# Altium footprint library hand_ad_lib.PcbLib: 105 footprints (part 6 of 7)
Each footprint in its own frame and in the unit in brackets; x right, y up, seen from the top. Pads: shape width x height; smd on the part's side, far side on the other; paste and mask are expansions set on the pad; w line width, h text height; cw(c..) or ccw(c..) is an arc to the next point about the centre after c.
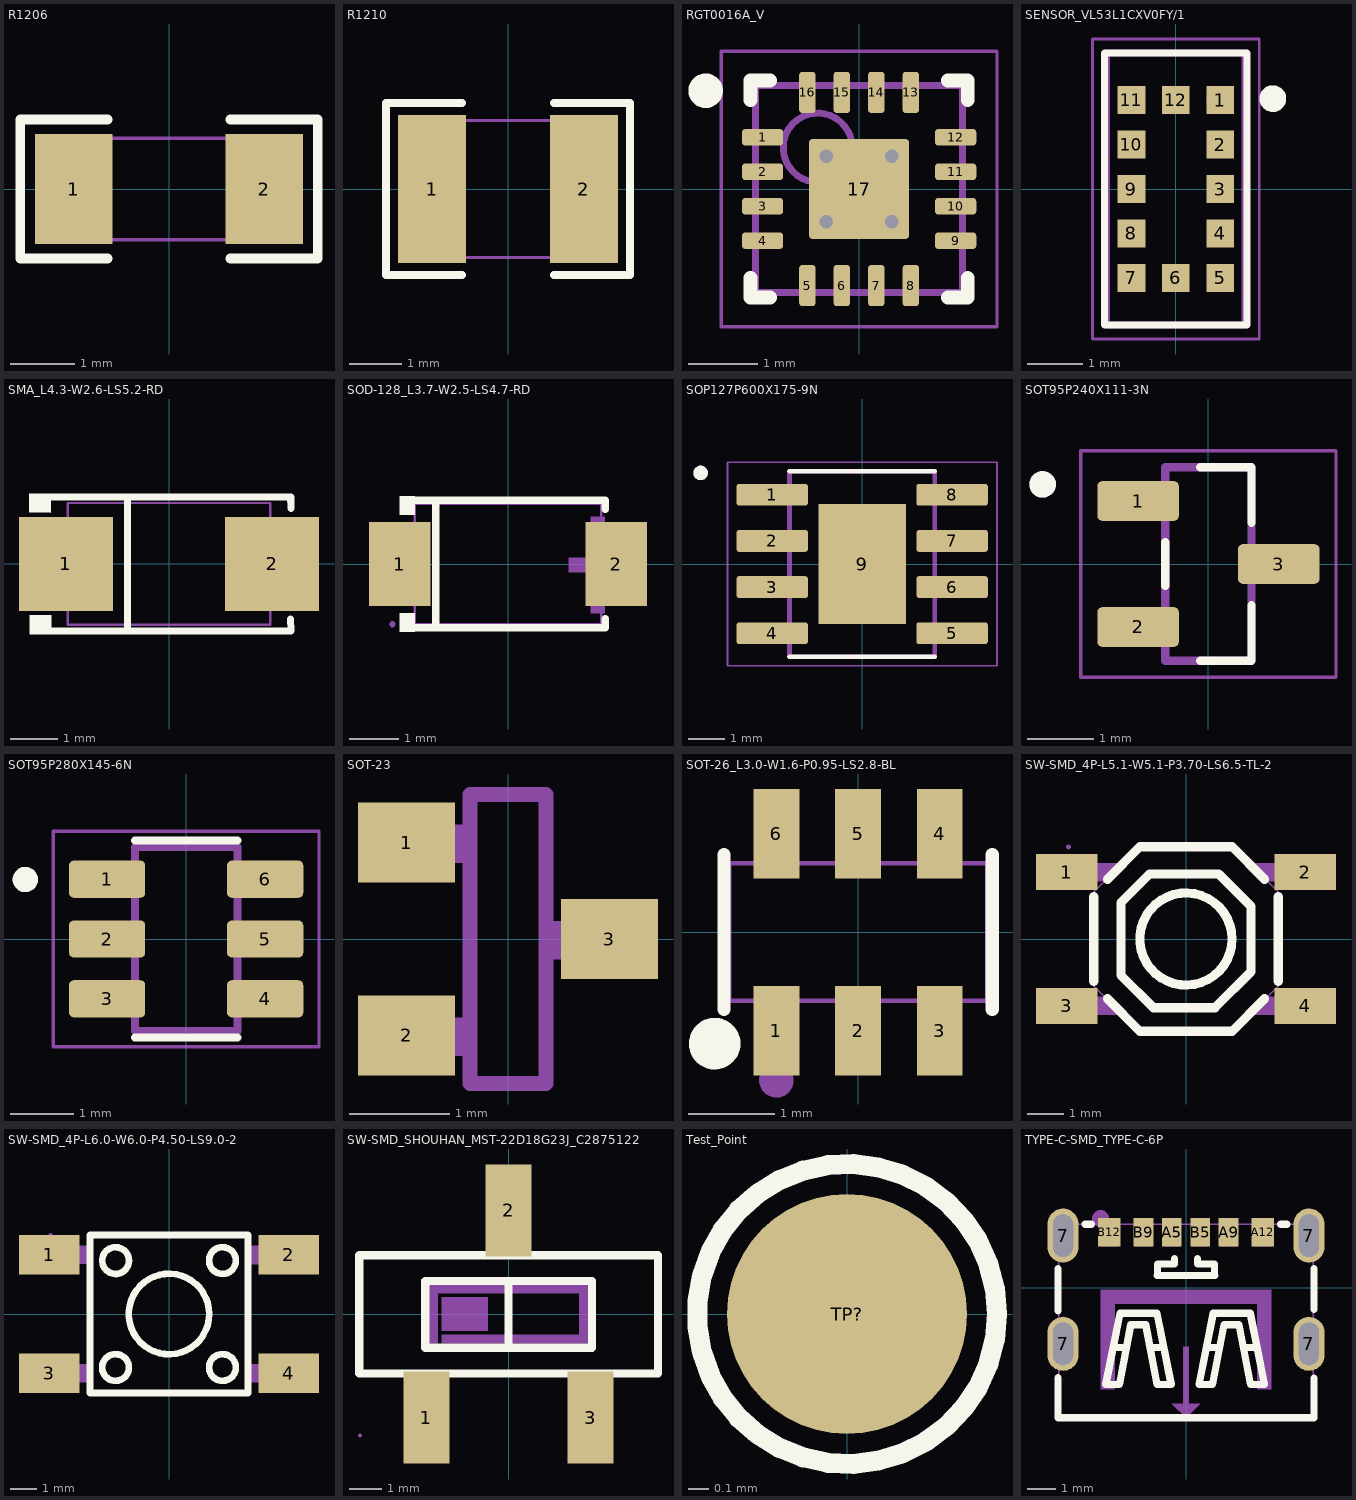
[diagram p5: the footprints below, top view; thin cyan lines are the x and y axes]

## R1206 [mm]
pads (2):
  rect 1.208x1.701 smd paste-100 mask+0.051: 1(-1.479,0) 2(1.479,0)
Top Overlay:
  lines w0.152: -0.951,-1.079 -2.311,-1.079 -2.311,1.079 -0.951,1.079 ; 0.951,-1.079 2.311,-1.079 2.311,1.079 0.951,1.079
Top Paste:
  region: 0.875,-0.75 0.875,-0.389 0.975,-0.289 1.186,-0.289 1.286,-0.189 1.286,0.189 1.186,0.289 0.975,0.289 0.875,0.389 0.875,0.75 0.975,0.85 1.983,0.85 2.083,0.75 2.083,-0.75 1.983,-0.85 0.975,-0.85
  region: -0.875,-0.75 -0.875,-0.389 -0.975,-0.289 -1.186,-0.289 -1.286,-0.189 -1.286,0.189 -1.186,0.289 -0.975,0.289 -0.875,0.389 -0.875,0.75 -0.975,0.85 -1.983,0.85 -2.083,0.75 -2.083,-0.75 -1.983,-0.85 -0.975,-0.85
Mechanical 15:
  region: -1.49,-0.787 -1.491,-0.763 -1.526,-0.729 -1.574,-0.729 -1.609,-0.763 -1.61,-0.788 -1.61,-0.787 -1.609,-0.812 -1.574,-0.846 -1.526,-0.846 -1.491,-0.812
  region: -1.55,-0.788 -1.55,0.788 -1.1,0.788 -1.1,-0.788
  region: 1.55,-0.788 1.55,0.788 1.1,0.788 1.1,-0.788
  lines w0.051: -1.55,-0.788 -1.55,0.788 1.55,0.788 1.55,-0.788 -1.55,-0.788
3D body "HoYH1206-1W-200mR.x_t": height 0.56, standoff 0, extent -1.6,-0.8 1.6,0.801

## R1210 [mm]
pads (2):
  rect 1.283x2.808 smd paste-100 mask+0.051: 1(-1.441,0) 2(1.441,0)
Top Overlay:
  lines w0.152: -0.876,-1.633 -2.311,-1.633 -2.311,1.633 -0.876,1.633 ; 0.876,-1.633 2.311,-1.633 2.311,1.633 0.876,1.633
Top Paste:
  region: 0.8,-1.304 0.8,-0.577 0.9,-0.477 1.136,-0.477 1.236,-0.377 1.236,0.377 1.136,0.477 0.9,0.477 0.8,0.577 0.8,1.304 0.9,1.404 1.983,1.404 2.083,1.304 2.083,-1.304 1.983,-1.404 0.9,-1.404
  region: -0.8,-1.304 -0.8,-0.577 -0.9,-0.477 -1.136,-0.477 -1.236,-0.377 -1.236,0.377 -1.136,0.477 -0.9,0.477 -0.8,0.577 -0.8,1.304 -0.9,1.404 -1.983,1.404 -2.083,1.304 -2.083,-1.304 -1.983,-1.404 -0.9,-1.404
Mechanical 15:
  region: -1.49,-1.3 -1.491,-1.276 -1.526,-1.242 -1.574,-1.242 -1.609,-1.276 -1.61,-1.3 -1.609,-1.324 -1.574,-1.358 -1.526,-1.358 -1.491,-1.324
  region: -1.55,-1.3 -1.55,1.3 -1.05,1.3 -1.05,-1.3
  region: 1.55,-1.3 1.55,1.3 1.05,1.3 1.05,-1.3
  lines w0.051: -1.55,-1.3 -1.55,1.3 1.55,1.3 1.55,-1.3 -1.55,-1.3
3D body "1210W2F300LT5E.x_t": height 0.55, standoff 0, extent -1.55,-1.3 1.55,1.301

## RGT0016A_V [mm] "QFN, 16-Leads, Body 3x3mm, Pitch 0.5mm, Thermal Pad 1.45x1.45mm"
height 1
pads (17):
  rrect42% 0.6x0.24 smd: 1(-1.4,0.75) 2(-1.4,0.25) 3(-1.4,-0.25) 4(-1.4,-0.75) 9(1.4,-0.75) 10(1.4,-0.25) 11(1.4,0.25) 12(1.4,0.75)
  rrect42% 0.24x0.6 smd: 5(-0.75,-1.4) 6(-0.25,-1.4) 7(0.25,-1.4) 8(0.75,-1.4) 13(0.75,1.4) 14(0.25,1.4) 15(-0.25,1.4) 16(-0.75,1.4)
  rrect7% 1.45x1.45 smd paste-0.725: 17(0,0)
via 0.475,0.475 diameter 0.5 hole 0.2
via 0.475,-0.475 diameter 0.5 hole 0.2
via -0.475,-0.475 diameter 0.5 hole 0.2
via -0.475,0.475 diameter 0.5 hole 0.2
Top Overlay:
  circle w0.25: c-2.225,1.425 r0.125
  lines w0.2: -1.575,-1.29 -1.575,-1.575 -1.29,-1.575 ; -1.575,1.29 -1.575,1.575 -1.29,1.575 ; 1.29,-1.575 1.575,-1.575 1.575,-1.29 ; 1.29,1.575 1.575,1.575 1.575,1.29
Mechanical 1:
  text ".Designator" at -1.4,-0.75 h0.5
Mechanical 13:
  circle w0.1: c-0.6,0.6 r0.5
  lines w0.1: -1.5,-1.5 -1.5,1.5 1.5,1.5 1.5,-1.5 -1.5,-1.5
Mechanical 15:
  lines w0.05: -2,-2 -2,2 2,2 2,-2 -2,-2
  lines w0.1: -0.5,0 0.5,0 ; 0,-0.5 0,0.5
3D body: height 1, standoff 0, extent -1.5,-1.5 1.5,1.5

## SENSOR_VL53L1CXV0FY/1 [mm]
pads (12):
  rect 0.5x0.5 smd: 1(0.8,1.6) 2(0.8,0.8) 3(0.8,0) 4(0.8,-0.8) 5(0.8,-1.6) 6(0,-1.6) 7(-0.8,-1.6) 8(-0.8,-0.8) 9(-0.8,0) 10(-0.8,0.8) 11(-0.8,1.6) 12(0,1.6)
Top Overlay:
  circle w0.24: c1.746,1.627 r0.12
  lines w0.127: -1.28,-2.45 1.28,-2.45 1.28,2.45 -1.28,2.45 -1.28,-2.45
Mechanical 13:
  circle w0.3: c0.8,1.6 r0.1
  lines w0.127: -1.25,-2.45 -1.25,2.45 1.25,2.45 1.25,-2.45 -1.25,-2.45
Mechanical 15:
  lines w0.05: -1.5,-2.7 -1.5,2.7 1.5,2.7 1.5,-2.7 -1.5,-2.7
3D body "step_temp.STEP": height 1.6, standoff 0, extent -1.25,-2.45 1.25,2.45

## SMA_L4.3-W2.6-LS5.2-RD [mm]
pads (2):
  rect 2x2 smd: 1(-2.2,0) 2(2.2,0)
Top Overlay:
  region: -2.512,-1.096 -2.513,-1.503 -2.973,-1.498 -2.969,-1.096
  region: -2.52,1.502 -2.521,1.096 -2.981,1.1 -2.977,1.502
  lines w0.152: -2.596,-1.426 2.596,-1.426 ; -2.596,1.426 2.596,1.426 2.603,1.187 ; -0.884,-1.426 -0.884,1.426 ; 2.593,-1.176 2.6,-1.415
Mechanical 6:
  region: 2.014,-0.675 2.014,0.675 1.811,0.675 1.811,-0.675
  region: 2.29,-0.09 2.29,0.112 1.48,0.112 1.48,-0.09
  region: -2.317,-0.101 -2.317,0.101 -1.507,0.101 -1.507,-0.101
Mechanical 15:
  region: -1.48,0.725 -1.48,-0.725 -2.605,-0.725 -2.605,0.725
  region: 2.605,0.725 2.605,-0.725 1.48,-0.725 1.48,0.725
  region: -2.545,-1.3 -2.546,-1.275 -2.58,-1.241 -2.629,-1.241 -2.664,-1.275 -2.665,-1.3 -2.664,-1.324 -2.63,-1.359 -2.581,-1.359 -2.546,-1.324
  lines w0.051: -2.16,-1.3 2.16,-1.3 2.16,1.3 -2.16,1.3 -2.16,-1.3
3D body "SS34.x_t": height 2.1, standoff 0, extent -2.35,-1.3 2.35,1.3

## SOD-128_L3.7-W2.5-LS4.7-RD [mm]
pads (2):
  rect 1.25x1.7 smd: 1(-2.2,0) 2(2.2,0)
Top Overlay:
  region: -1.9,-1.377 -1.9,-1 -2.205,-1 -2.205,-1.377
  region: -1.9,1.377 -1.9,1 -2.205,1 -2.205,1.377
  lines w0.152: -1.976,-1.301 1.976,-1.301 1.976,-1.108 ; -1.976,1.301 1.976,1.301 1.976,1.108 ; -1.467,-1.301 -1.467,1.301
Mechanical 6:
  region: 1.972,0.96 1.972,-1 1.678,-1 1.678,0.96
  region: 2.413,0.127 2.413,-0.167 1.237,-0.167 1.237,0.127
  region: -2.794,0.254 -2.794,-0.04 -1.618,-0.04 -1.618,0.254
Mechanical 15:
  region: 2.35,-0.7 2.35,0.7 1.6,0.7 1.6,-0.7
  region: -2.35,-0.7 -2.35,0.7 -1.6,0.7 -1.6,-0.7
  region: -2.29,-1.225 -2.291,-1.201 -2.326,-1.168 -2.374,-1.168 -2.409,-1.201 -2.41,-1.225 -2.409,-1.249 -2.374,-1.282 -2.326,-1.282 -2.291,-1.249
  lines w0.051: -1.9,-1.225 1.9,-1.225 1.9,1.225 -1.9,1.225 -1.9,-1.225
3D body "PDZVTR5.1B.x_t": height 0.96, standoff 0, extent -2.35,-1.245 2.35,1.245

## SOP127P600X175-9N [mm]
height 1.75
pads (9):
  rrect25% 1.97x0.6 smd: 1(-2.475,1.905) 2(-2.475,0.635) 3(-2.475,-0.635) 4(-2.475,-1.905) 5(2.475,-1.905) 6(2.475,-0.635) 7(2.475,0.635) 8(2.475,1.905)
  rect 2.413x3.302 smd paste-3: 9(0,0)
Top Overlay:
  circle w0.2: c-4.445,2.505 r0.1
  lines w0.127: -2,-2.55 2,-2.55 ; -2,2.55 2,2.55
Top Paste:
  region: 0.645,-0.82 -0.645,-0.82 -0.645,0.82 0.645,0.82
Mechanical 13:
  circle w0.2: c-4.445,2.505 r0.1
  lines w0.127: -2,-2.55 -2,2.55 2,2.55 2,-2.55 -2,-2.55
Mechanical 15:
  lines w0.05: -3.71,-2.8 -3.71,2.8 3.71,2.8 3.71,-2.8 -3.71,-2.8
3D body "step_temp.STEP": height 1.75, standoff 0, extent -3,-2.45 3,2.45

## SOT95P240X111-3N [mm]
height 1.11
pads (3):
  rrect25% 1.23x0.6 smd: 1(-1.06,0.95) 2(-1.06,-0.95) 3(1.06,0)
Top Overlay:
  circle w0.2: c-2.5,1.2 r0.1
  lines w0.127: -0.65,-0.33 -0.65,0.33 ; -0.125,-1.46 0.65,-1.46 0.65,-0.62 ; -0.125,1.46 0.65,1.46 0.65,0.62
Mechanical 13:
  circle w0.2: c-2.5,1.2 r0.1
  lines w0.127: -0.65,-1.46 -0.65,1.46 0.65,1.46 0.65,-1.46 -0.65,-1.46
Mechanical 15:
  lines w0.05: -1.925,-1.71 1.925,-1.71 1.925,1.71 -1.925,1.71 -1.925,-1.71
3D body "step_temp.STEP": height 1.11, standoff 0, extent -1.2,-1.45 1.2,1.45

## SOT95P280X145-6N [mm]
pads (6):
  rrect25% 1.21x0.59 smd: 1(-1.255,0.95) 2(-1.255,0) 3(-1.255,-0.95) 4(1.255,-0.95) 5(1.255,0) 6(1.255,0.95)
Top Overlay:
  circle w0.2: c-2.555,0.945 r0.1
  lines w0.127: -0.813,-1.565 0.813,-1.565 ; -0.813,1.565 0.813,1.565
Mechanical 13:
  circle w0.2: c-2.555,0.945 r0.1
  lines w0.127: -0.813,-1.462 0.813,-1.462 0.813,1.462 -0.813,1.462 -0.813,-1.462
Mechanical 15:
  lines w0.05: -2.11,-1.713 -2.11,1.713 2.11,1.713 2.11,-1.713 -2.11,-1.713
3D body "USBLC6-2SC6.STEP": height 1.44, standoff -0.01, extent -1.4,-1.462 1.4,1.462

## SOT-23 [mil]
pads (3):
  rect 38.27x31.57 smd: 1(-40,38) 2(-40,-38) 3(40,0)
Mechanical 13:
  region: -17,30 -37,30 -37,45 -17,45
  region: -17,-46 -37,-46 -37,-31 -17,-31
  region: 37,-8 17,-8 17,7 37,7
  lines w6: -15,-57 -15,57 15,57 15,-57 -15,-57
3D body "step_temp.STEP": height 44.09, standoff 0, extent -46.65,-57.48 46.65,57.48

## SOT-26_L3.0-W1.6-P0.95-LS2.8-BL [mm]
pads (6):
  rect 0.532x1.04 smd: 1(-0.95,-1.145) 2(0,-1.145) 3(0.95,-1.145) 4(0.95,1.145) 5(0,1.145) 6(-0.95,1.145)
Top Overlay:
  circle w0.3: c-1.668,-1.297 r0.15
  lines w0.152: -1.561,-0.901 -1.561,0.901 ; 1.561,-0.901 1.561,0.901
Mechanical 6:
  circle w0.2: c-0.95,-1.725 r0.1
Mechanical 15:
  region: -1.425,-1.425 -1.425,-1.4 -1.46,-1.366 -1.509,-1.366 -1.544,-1.4 -1.545,-1.425 -1.544,-1.449 -1.509,-1.484 -1.46,-1.484 -1.425,-1.449
  region: -1.15,-1.025 -0.75,-1.025 -0.75,-1.425 -1.15,-1.425
  region: -0.2,-1.025 0.2,-1.025 0.2,-1.425 -0.2,-1.425
  region: 0.75,-1.025 1.15,-1.025 1.15,-1.425 0.75,-1.425
  region: 0.75,-0.75 1.15,-0.75 1.15,-1.035 0.75,-1.035
  region: 0.75,1.025 1.15,1.025 1.15,1.425 0.75,1.425
  region: -0.2,1.025 0.2,1.025 0.2,1.425 -0.2,1.425
  region: -1.15,1.025 -0.75,1.025 -0.75,1.425 -1.15,1.425
  region: -0.2,-0.75 0.2,-0.75 0.2,-1.035 -0.2,-1.035
  region: -1.15,-0.75 -0.75,-0.75 -0.75,-1.035 -1.15,-1.035
  region: -0.75,0.75 -1.15,0.75 -1.15,1.035 -0.75,1.035
  region: 0.2,0.75 -0.2,0.75 -0.2,1.035 0.2,1.035
  region: 1.15,0.75 0.75,0.75 0.75,1.035 1.15,1.035
  lines w0.051: -1.5,-0.8 1.5,-0.8 1.5,0.8 -1.5,0.8 -1.5,-0.8
3D body "DMP2035UVT-7.x_t": height 0.95, standoff 0, extent -1.5,-1.4 1.5,1.4

## SW-SMD_4P-L5.1-W5.1-P3.70-LS6.5-TL-2 [mm]
pads (4):
  rect 1.7x1 smd: 1(-3.3,1.85) 2(3.3,1.85) 3(-3.3,-1.85) 4(3.3,-1.85)
Top Overlay:
  circle w0.254: c0,0 r1.275
  lines w0.254: -2.55,-1.168 -2.55,1.168 ; -2.17,-1.655 -1.275,-2.55 1.275,-2.55 2.17,-1.655 ; -2.17,1.655 -1.275,2.55 1.275,2.55 2.17,1.655 ; 2.55,-1.168 2.55,1.168 ; -1.801,-0.998 -0.899,-1.9 0.8,-1.9 1.801,-0.899 1.801,0.899 0.899,1.801 -1.001,1.801 -1.801,1.001 -1.801,-0.998
Mechanical 15:
  region: -3.19,2.55 -3.19,2.575 -3.225,2.61 -3.275,2.61 -3.31,2.575 -3.31,2.55 -3.31,2.525 -3.275,2.49 -3.225,2.49 -3.19,2.525
  region: 2.85,-2.1 2.85,-1.6 3.25,-1.6 3.25,-2.1
  region: 2.2,1.6 1.7,2.1 2.86,2.1 2.86,1.6
  region: 2.85,1.6 2.85,2.1 3.25,2.1 3.25,1.6
  region: -3.25,1.599 -3.25,2.099 -2.85,2.099 -2.85,1.599
  region: -3.25,-2.1 -3.25,-1.6 -2.85,-1.6 -2.85,-2.1
  region: -2.2,-1.6 -1.7,-2.1 -2.86,-2.1 -2.86,-1.6
  region: 2.201,-1.601 1.701,-2.101 2.861,-2.101 2.861,-1.601
  region: -2.2,1.599 -1.7,2.099 -2.86,2.1 -2.86,1.6
  lines w0.051: -2.55,-1.3 -1.3,-2.55 1.3,-2.55 2.55,-1.3 2.55,1.3 1.3,2.55 -1.3,2.55 -2.55,1.3 -2.55,-1.3
3D body "TS-1187A-B-A-B-3D.x_t": height 1.55, standoff 0, extent -3.2,-2.6 3.2,2.6

## SW-SMD_4P-L6.0-W6.0-P4.50-LS9.0-2 [mm]
pads (4):
  rect 2.3x1.5 smd: 1(-4.55,2.25) 2(4.55,2.25) 3(-4.55,-2.25) 4(4.55,-2.25)
Top Overlay:
  circle w0.254: c0,0 r1.529
  circle w0.254: c2.032,-2.032 r0.508
  circle w0.254: c-2.032,-2.032 r0.508
  circle w0.254: c2.032,2.032 r0.508
  circle w0.254: c-2.03,2.03 r0.508
  lines w0.254: -3,-3 3,-3 3,3 -3,3 -3,-3
Mechanical 15:
  region: -4.44,3 -4.44,3.025 -4.475,3.06 -4.525,3.06 -4.56,3.025 -4.56,3 -4.56,2.975 -4.525,2.94 -4.475,2.94 -4.44,2.975
  region: -3.51,1.9 -3.51,2.6 -2.99,2.6 -2.99,1.9
  region: -4.5,1.9 -4.5,2.6 -3.5,2.6 -3.5,1.9
  region: -3.51,-2.6 -3.51,-1.9 -2.99,-1.9 -2.99,-2.6
  region: -4.5,-2.6 -4.5,-1.9 -3.5,-1.9 -3.5,-2.6
  region: 2.99,-2.6 2.99,-1.9 3.51,-1.9 3.51,-2.6
  region: 3.5,-2.6 3.5,-1.9 4.5,-1.9 4.5,-2.6
  region: 2.99,1.9 2.99,2.6 3.51,2.6 3.51,1.9
  region: 3.5,1.9 3.5,2.6 4.5,2.6 4.5,1.9
  lines w0.051: -3,-3 3,-3 3,3 -3,3 -3,-3
3D body "KH-6X6X5H-STM.x_t": height 3.4, standoff 0, extent -4.2,-3.2 4.2,3.2

## SW-SMD_SHOUHAN_MST-22D18G23J_C2875122 [mm]
pads (3):
  rect 1.4x2.8 smd: 1(-2.5,-3.155) 2(0,3.155) 3(2.5,-3.155)
Top Overlay:
  lines w0.254: -2.54,-1.029 -2.54,1.003 ; -2.54,-1.029 2.54,-1.029 2.54,1.003 -2.54,1.003 ; -2.54,-1.029 -2.54,1.003 ; -2.54,-1.029 0,-1.029 0,1.003 -2.54,1.003 ; -4.55,-1.813 -4.55,1.787 4.55,1.787 4.55,-1.813 -4.55,-1.813
Mechanical 6:
  region: -2.032,0.508 -0.635,0.508 -0.635,-0.508 -2.032,-0.508
  region: -2.413,-0.889 -2.413,0.889 2.413,0.889 2.413,-0.889 -2.032,-0.889 -2.032,-0.635 2.159,-0.635 2.159,0.635 -2.159,0.635 -2.159,-0.889
Mechanical 15:
  region: -0.3,2.7 -0.3,3.7 0.3,3.7 0.3,2.7
  region: -0.3,1.74 -0.3,2.71 0.3,2.71 0.3,1.74
  region: 2.2,-3.7 2.2,-2.7 2.8,-2.7 2.8,-3.7
  region: 2.2,-2.71 2.2,-1.74 2.8,-1.74 2.8,-2.71
  region: -2.8,-3.7 -2.8,-2.7 -2.2,-2.7 -2.2,-3.7
  region: -2.8,-2.71 -2.8,-1.74 -2.2,-1.74 -2.2,-2.71
  region: -4.465,-3.7 -4.465,-3.675 -4.5,-3.64 -4.55,-3.64 -4.585,-3.675 -4.585,-3.7 -4.585,-3.725 -4.55,-3.76 -4.5,-3.76 -4.465,-3.725
  lines w0.051: -4.525,-1.75 4.525,-1.75 4.525,1.75 -4.525,1.75 -4.525,-1.75
3D body "MST-22D18G2 3J.x_t": height 5.8, standoff 0, extent -4.55,-3.7 4.55,3.7

## Test_Point [mm] "Test Point"
height 0.03
pads (1):
  round 1.2 smd paste-0.6: TP?(0,0)
Top Overlay:
  circle w0.1: c0,0 r0.75
3D body: height 0.03, standoff 0, extent -0.6,-0.6 0.6,0.6

## TYPE-C-SMD_TYPE-C-6P [mm]
pads (10):
  oval 1.1x1.9 hole 0.7 slot 1.5 at 90 deg: 7(-4.32,-1.963) 7(-4.32,1.838) 7(4.32,-1.963) 7(4.32,1.838)
  rect 0.7x1 smd paste-100 mask+0.051: A5(-0.5,1.963) A9(1.5,1.963) B5(0.5,1.963) B9(-1.5,1.963)
  rect 0.8x1 smd paste-100 mask+0.051: A12(2.7,1.963) B12(-2.7,1.963)
Top Overlay:
  lines w0.25: -4.501,-3.164 -4.501,-3.141 -4.501,-4.563 4.501,-4.563 4.501,-3.164 ; -4.5,-0.805 -4.5,0.638 -4.5,0.68 ; -3.541,2.238 -3.329,2.238 ; -1.01,0.438 1.01,0.438 ; -1,0.438 -1,0.838 -0.4,0.838 -0.4,1.038 ; 0.4,1.038 0.4,0.838 1,0.838 1,0.438 ; 3.329,2.238 3.541,2.238 ; 4.5,-0.762 4.5,0.688
  lines w0.254: -2.518,-2.095 -2.119,-2.095 ; -1.219,-2.095 -0.819,-2.095 ; 0.759,-2.09 1.158,-2.09 ; 2.058,-2.09 2.458,-2.09 ; -2.818,-3.396 -2.343,-3.396 -1.941,-1.295 -1.413,-1.295 -1.014,-3.396 -0.519,-3.396 -1.019,-0.894 -2.32,-0.894 -2.818,-3.396 ; 0.459,-3.391 0.934,-3.391 1.335,-1.29 1.864,-1.29 2.263,-3.391 2.758,-3.391 2.257,-0.889 0.957,-0.889 0.459,-3.391
Top Paste:
  region: 2.3,2.463 3.1,2.463 3.1,1.463 2.3,1.463
  region: 1.15,2.463 1.85,2.463 1.85,1.463 1.15,1.463
  region: 0.15,2.463 0.85,2.463 0.85,1.463 0.15,1.463
  region: -0.85,2.463 -0.15,2.463 -0.15,1.463 -0.85,1.463
  region: -1.85,2.463 -1.15,2.463 -1.15,1.463 -1.85,1.463
  region: -3.1,2.463 -2.3,2.463 -2.3,1.463 -3.1,1.463
  region: 3.77,-1.563 3.77,-1.453 3.854,-1.251 4.008,-1.096 4.21,-1.013 4.429,-1.013 4.631,-1.096 4.786,-1.251 4.87,-1.453 4.87,-1.563 4.87,-2.363 4.87,-2.472 4.786,-2.674 4.631,-2.829 4.429,-2.913 4.21,-2.913 4.008,-2.829 3.854,-2.674 3.77,-2.472 3.77,-2.363
  region: -4.87,-1.563 -4.87,-1.453 -4.786,-1.251 -4.631,-1.096 -4.429,-1.013 -4.21,-1.013 -4.008,-1.096 -3.854,-1.251 -3.77,-1.453 -3.77,-1.563 -3.77,-2.363 -3.77,-2.472 -3.854,-2.674 -4.008,-2.829 -4.21,-2.913 -4.429,-2.913 -4.631,-2.829 -4.786,-2.674 -4.87,-2.472 -4.87,-2.363
  region: 3.77,2.238 3.77,2.347 3.854,2.549 4.008,2.704 4.21,2.788 4.429,2.788 4.631,2.704 4.786,2.549 4.87,2.347 4.87,2.238 4.87,1.438 4.87,1.328 4.786,1.126 4.631,0.971 4.429,0.888 4.21,0.888 4.008,0.971 3.854,1.126 3.77,1.328 3.77,1.438
  region: -4.87,2.238 -4.87,2.347 -4.786,2.549 -4.631,2.704 -4.429,2.788 -4.21,2.788 -4.008,2.704 -3.854,2.549 -3.77,2.347 -3.77,2.238 -3.77,1.438 -3.77,1.328 -3.854,1.126 -4.008,0.971 -4.21,0.888 -4.429,0.888 -4.631,0.971 -4.786,1.126 -4.87,1.328 -4.87,1.438
Mechanical 6:
  circle w0.3: c-3,2.438 r0.15
  region: 0,-4.062 -0.1,-4.062 -0.1,-2.062 0.1,-2.062 0.1,-4.062
  region: -0.5,-4.062 0.5,-4.062 0,-4.562
  region: -2.5,-0.062 2.5,-0.062 2.5,-0.562 -2.5,-0.562
  region: 3,-3.562 3,-0.062 2.5,-0.062 2.5,-3.562
  region: -3,-3.562 -3,-0.062 -2.5,-0.062 -2.5,-3.562
Mechanical 15:
  region: -3,2.213 -2.4,2.213 -2.4,1.463 -3,1.463
  region: 2.4,2.213 3,2.213 3,1.463 2.4,1.463
  region: -1.78,2.213 -1.22,2.213 -1.22,1.463 -1.78,1.463
  region: 1.22,2.213 1.78,2.213 1.78,1.463 1.22,1.463
  region: 0.24,2.213 0.76,2.213 0.76,1.463 0.24,1.463
  region: -0.76,2.213 -0.24,2.213 -0.24,1.463 -0.76,1.463
  region: -4.47,2.238 -4.17,2.238 -4.17,1.438 -4.47,1.438
  region: -4.47,-1.563 -4.17,-1.563 -4.17,-2.363 -4.47,-2.363
  region: 4.17,-1.563 4.47,-1.563 4.47,-2.363 4.17,-2.363
  region: 4.17,2.238 4.47,2.238 4.47,1.438 4.17,1.438
  region: 4.53,-4.562 4.529,-4.538 4.494,-4.505 4.446,-4.505 4.411,-4.538 4.41,-4.563 4.411,-4.587 4.446,-4.62 4.494,-4.62 4.529,-4.587
  lines w0.051: -4.47,-4.562 4.47,-4.562 4.47,2.238 -4.47,2.238 -4.47,-4.562
3D body "USB-TYPE-C-009.x_t": height 3.22, standoff -0.94, extent -4.47,-4.562 4.47,2.238